# Altium footprint library PartsDatabaseV16.1.PcbLib: 145 footprints (part 8 of 10)
Each footprint in its own frame and in the unit in brackets; x right, y up, seen from the top. Pads: shape width x height; smd on the part's side, far side on the other; paste and mask are expansions set on the pad; w line width, h text height; cw(c..) or ccw(c..) is an arc to the next point about the centre after c.
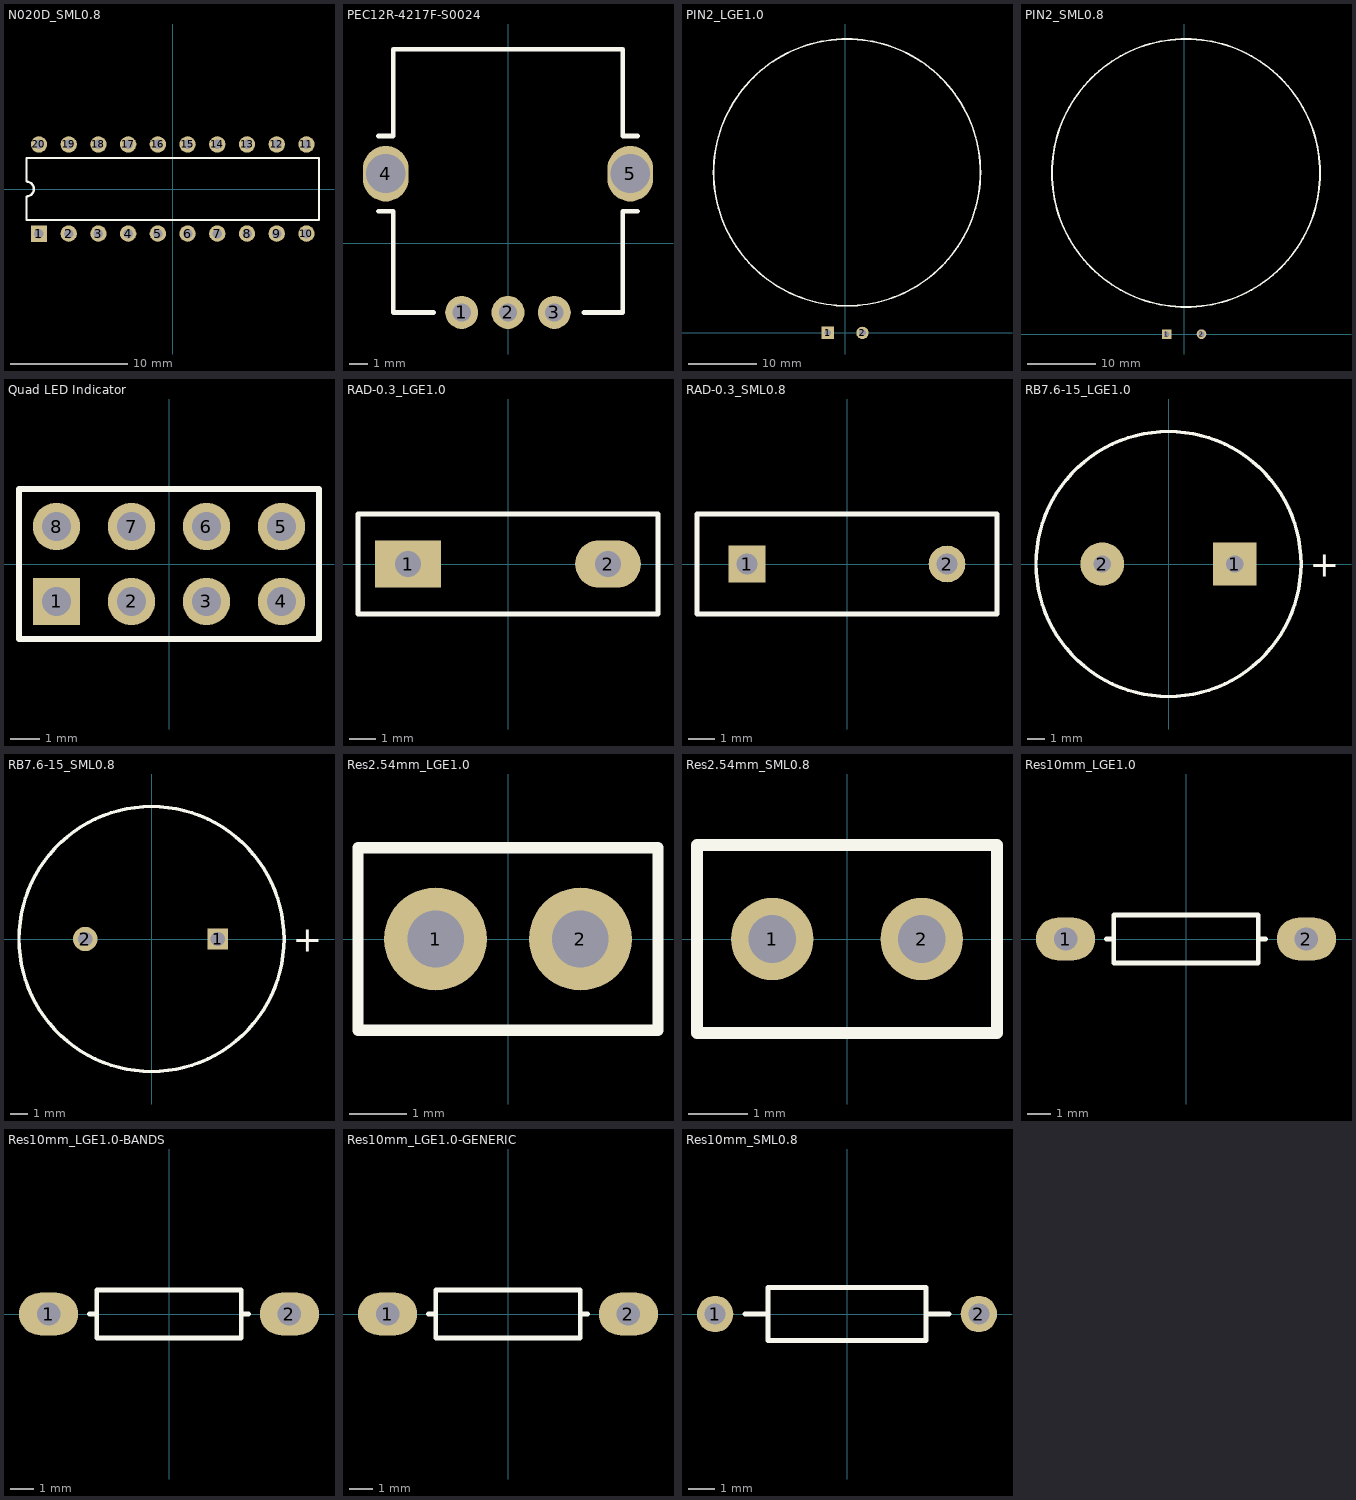
[diagram p7: the footprints below, top view; thin cyan lines are the x and y axes]

## N020D_SML0.8 [mm] "DIP; 20 Leads; Row Spacing 7.62 mm; Pitch 2.54 mm"
height 5.08
pads (20):
  rect 1.4x1.4 hole 0.813: 1(-11.43,-3.81)
  round 1.4 hole 0.813: 2(-8.89,-3.81) 3(-6.35,-3.81) 4(-3.81,-3.81) 5(-1.27,-3.81) 6(1.27,-3.81) 7(3.81,-3.81) 8(6.35,-3.81) 9(8.89,-3.81) 10(11.43,-3.81) 11(11.43,3.81) 12(8.89,3.81) 13(6.35,3.81) 14(3.81,3.81) 15(1.27,3.81) 16(-1.27,3.81) 17(-3.81,3.81) 18(-6.35,3.81) 19(-8.89,3.81) 20(-11.43,3.81)
Top Overlay:
  lines w0.2: -12.5,-2.65 -12.5,-0.635 ccw(c-12.5,0) -12.5,0.635 -12.5,2.65 12.5,2.65 12.5,-2.65 -12.5,-2.65
3D body "DIP20.STEP": height 4.56, standoff -3.82, extent -13.284,-3.986 13.256,3.834

## PCBComponent_1 [mm]

## PEC12R-4217F-S0024 [mil] "PEC12R-4217F-S0024 - Encoder Rotary"
pads (5):
  round 70 hole 39: 1(-98.5,-147.5) 2(0,-147.5) 3(98.5,-147.5)
  rrect100% 97x118 hole 83: 4(-260,147.5) 5(260,147.5)
Top Overlay:
  lines w10: -275.5,67.5 -244,67.5 -244,-147.5 -158.5,-147.5 ; -275.5,227.5 -244,227.5 -244,412.5 0,412.5 244,412.5 244,227.5 275.5,227.5 ; 161.5,-147.5 244,-147.5 244,67.5 275.5,67.5
3D body "PEC11-4025F-N0024.STEP": height 1260.32, standoff -148.7, extent -257.92,-152 255.92,398.99

## PIN2_LGE1.0 [mm] "Photosensitive Diode; 2 Leads"
pads (2):
  rect 1.8x1.8 hole 0.991: 1(-2.54,0)
  round 1.8 hole 0.991: 2(2.54,0)
Top Overlay:
  circle w0.254: c0.279,23.495 r19.533

## PIN2_SML0.8 [mm] "Photosensitive Diode; 2 Leads"
pads (2):
  rect 1.4x1.4 hole 0.813: 1(-2.54,0)
  round 1.4 hole 0.813: 2(2.54,0)
Top Overlay:
  circle w0.254: c0.279,23.495 r19.533

## Quad LED Indicator [mm]
pads (8):
  rect 1.6x1.6 hole 0.991: 1(-3.81,-1.27)
  round 1.6 hole 0.991: 2(-1.27,-1.27) 3(1.27,-1.27) 4(3.81,-1.27) 5(3.81,1.27) 6(1.27,1.27) 7(-1.27,1.27) 8(-3.81,1.27)
Top Overlay:
  lines w0.2: -5.08,-2.54 -5.08,2.54 5.08,2.54 5.08,-2.54 -5.08,-2.54

## RAD-0.3_LGE1.0 [mm] "Radial Cap, Thru-Hole; 2 Leads; 0.3 in Pin Spacing"
height 6
pads (2):
  rect 2.5x1.8 hole 0.991: 1(-3.81,0)
  oval 2.5x1.8 hole 0.991: 2(3.81,0)
Top Overlay:
  lines w0.2: -5.715,-1.905 -5.715,1.905 5.715,1.905 5.715,-1.905 -5.715,-1.905

## RAD-0.3_SML0.8 [mm] "Radial Cap, Thru-Hole; 2 Leads; 0.3 in Pin Spacing"
height 6
pads (2):
  rect 1.4x1.4 hole 0.813: 1(-3.81,0)
  round 1.4 hole 0.813: 2(3.81,0)
Top Overlay:
  lines w0.2: -5.715,-1.905 5.715,-1.905 5.715,1.905 -5.715,1.905 -5.715,-1.905

## RB7.6-15_LGE1.0 [mm] "Polarized Capacitor (Radial); 2 Leads"
pads (2):
  rect 2.5x2.5 hole 0.991: 1(3.81,0)
  round 2.5 hole 0.991: 2(-3.81,0)
Top Overlay:
  circle w0.2: c0,0 r7.62
  text "+" at 8.132,-0.737 h1.5

## RB7.6-15_SML0.8 [mm] "Polarized Capacitor (Radial); 2 Leads"
pads (2):
  rect 1.2x1.2 hole 0.813: 1(3.81,0)
  round 1.4 hole 0.813: 2(-3.81,0)
Top Overlay:
  circle w0.2: c0,0 r7.62
  text "+" at 8.132,-0.737 h1.5

## Res2.54mm_LGE1.0 [mm] "Resistor,Thru-Hole, Dipped Radial; Body 5.1 x 3.2 mm (WxT) Pin Spacing 2.54 mm (typ)"
pads (2):
  round 1.8 hole 0.991: 1(-1.27,0) 2(1.27,0)
Top Overlay:
  lines w0.2: -2.629,-1.6 -2.629,1.6 2.629,1.6 2.629,-1.6 -2.629,-1.6

## Res2.54mm_SML0.8 [mm] "Resistor,Thru-Hole, Dipped Radial; Body 5.1 x 3.2 mm (WxT) Pin Spacing 2.54 mm (typ)"
pads (2):
  round 1.4 hole 0.813: 1(-1.27,0) 2(1.27,0)
Top Overlay:
  lines w0.2: -2.55,-1.6 2.55,-1.6 2.55,1.6 -2.55,1.6 -2.55,-1.6

## Res10mm_LGE1.0 [mm] "Axial Device, Thru-Hole; 2 Leads; 0.4 in Pin Spacing"
pads (2):
  oval 2.5x1.8 hole 0.991: 1(-5.08,0) 2(5.08,0)
Top Overlay:
  lines w0.2: -3.365,0 -3.048,0 ; 3.048,0 3.365,0 ; -3.048,-1.016 3.048,-1.016 3.048,1.016 -3.048,1.016 -3.048,-1.016

## Res10mm_LGE1.0-BANDS [mm] "Axial Device, Thru-Hole; 2 Leads; 0.4 in Pin Spacing"
pads (2):
  oval 2.5x1.8 hole 0.991: 1(-5.08,0) 2(5.08,0)
Top Overlay:
  lines w0.2: -3.365,0 -3.048,0 ; 3.048,0 3.365,0 ; -3.048,-1.016 3.048,-1.016 3.048,1.016 -3.048,1.016 -3.048,-1.016
3D body "Resistor_ColorBands.step": height 2.27, standoff -3.2, extent -5.385,-1.143 5.385,1.168

## Res10mm_LGE1.0-GENERIC [mm] "Axial Device, Thru-Hole; 2 Leads; 0.4 in Pin Spacing"
pads (2):
  oval 2.5x1.8 hole 0.991: 1(-5.08,0) 2(5.08,0)
Top Overlay:
  lines w0.2: -3.365,0 -3.048,0 ; 3.048,0 3.365,0 ; -3.048,-1.016 3.048,-1.016 3.048,1.016 -3.048,1.016 -3.048,-1.016
3D body "Resistor_noBands.step": height 2.85, standoff -5.95, extent -5.33,-1.325 5.482,1.275

## Res10mm_SML0.8 [mm] "Axial Device, Thru-Hole; 2 Leads; 0.4 in Pin Spacing"
pads (2):
  round 1.4 hole 0.813: 1(-5.08,0) 2(5.08,0)
Top Overlay:
  lines w0.2: -3.924,0 -3.048,0 ; 3.048,0 3.924,0 ; -3.048,-1.016 -3.048,1.016 3.048,1.016 3.048,-1.016 -3.048,-1.016